# Altium footprint library Modules.PcbLib: 4 footprints
Each footprint in its own frame and in the unit in brackets; x right, y up, seen from the top. Pads: shape width x height; smd on the part's side, far side on the other; paste and mask are expansions set on the pad; w line width, h text height; cw(c..) or ccw(c..) is an arc to the next point about the centre after c.
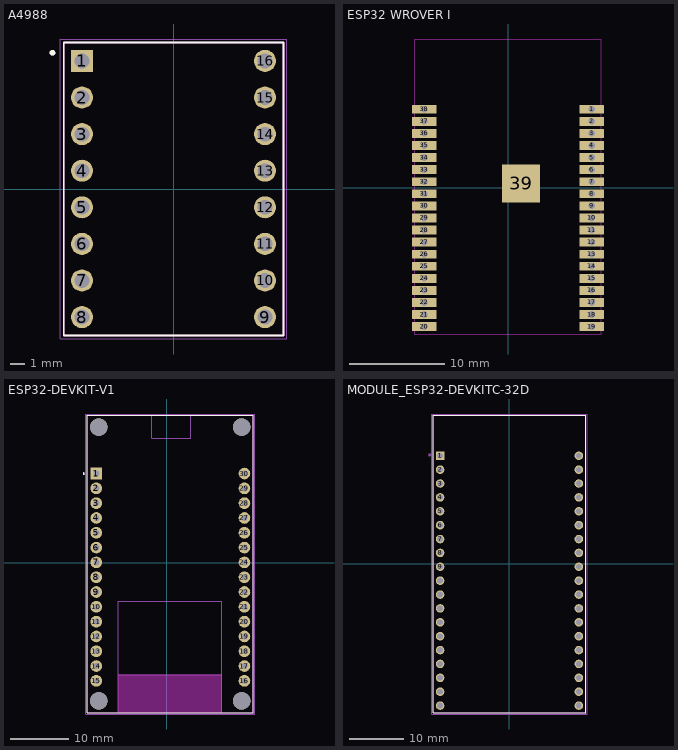
[diagram p0: the footprints below, top view; thin cyan lines are the x and y axes]

## A4988 [mm] "MODULE_A4988_STEPPER_MOTOR_DRIVER_CARRIER"
pads (16):
  rect 1.53x1.53 hole 1.02: 1(-6.35,8.89)
  round 1.53 hole 1.02: 2(-6.35,6.35) 3(-6.35,3.81) 4(-6.35,1.27) 5(-6.35,-1.27) 6(-6.35,-3.81) 7(-6.35,-6.35) 8(-6.35,-8.89) 9(6.35,-8.89) 10(6.35,-6.35) 11(6.35,-3.81) 12(6.35,-1.27) 13(6.35,1.27) 14(6.35,3.81) 15(6.35,6.35) 16(6.35,8.89)
Top Overlay:
  circle w0.2: c-8.4,9.45 r0.1
  lines w0.127: -7.62,-10.16 7.62,-10.16 7.62,10.16 -7.62,10.16 -7.62,-10.16
Mechanical 13:
  circle w0.2: c-8.4,9.45 r0.1
  lines w0.127: -7.62,-10.16 7.62,-10.16 7.62,10.16 -7.62,10.16 -7.62,-10.16
Mechanical 15:
  lines w0.05: -7.87,-10.41 -7.87,10.41 7.87,10.41 7.87,-10.41 -7.87,-10.41
3D body "A4988 STEPPER MOTOR DRIVER CARRIER.STEP": height 5.89, standoff -5.99, extent -7.62,-10.16 7.62,10.16

## ESP32 WROVER I [mm]
pads (39):
  rect 2.6x0.93 hole 0.7: 1(8.81,8.26) 2(8.81,6.99) 3(8.81,5.72) 4(8.81,4.45) 5(8.81,3.18) 6(8.81,1.91) 7(8.81,0.64) 8(8.81,-0.63) 9(8.81,-1.9) 10(8.81,-3.17) 11(8.81,-4.44) 12(8.81,-5.71) 13(8.81,-6.98) 14(8.81,-8.25) 15(8.81,-9.52) 16(8.81,-10.79) 17(8.81,-12.06) 18(8.81,-13.33) 19(8.81,-14.6) 20(-8.81,-14.6) 21(-8.81,-13.33) 22(-8.81,-12.06) 23(-8.81,-10.79) 24(-8.81,-9.52) 25(-8.81,-8.25) 26(-8.81,-6.98) 27(-8.81,-5.71) 28(-8.81,-4.44) 29(-8.81,-3.17) 30(-8.81,-1.9) 31(-8.81,-0.63) 32(-8.81,0.64) 33(-8.81,1.91) 34(-8.81,3.18) 35(-8.81,4.45) 36(-8.81,5.72) 37(-8.81,6.99) 38(-8.81,8.26)
  rect 4x4 smd: 39(1.38,0.47)
Keep-Out Layer:
  lines w0.127: -9.8,-15.4 -9.8,15.65 9.8,15.65 9.8,-15.4 -9.8,-15.4
3D body "ESP32-WROVER-I--3DModel-STEP-56544.STEP": height 3.65, standoff 0, extent -9.025,-15.7 8.975,15.7

## ESP32-DEVKIT-V1 [mm]
pads (34):
  rect 2x2 hole 1.02: 1(-12.098,15.341)
  round 2 hole 1.02: 2(-12.098,12.801) 3(-12.098,10.261) 4(-12.098,7.721) 5(-12.098,5.181) 6(-12.098,2.641) 7(-12.098,0.101) 8(-12.098,-2.439) 9(-12.098,-4.979) 10(-12.098,-7.519) 11(-12.098,-10.059) 12(-12.098,-12.599) 13(-12.098,-15.139) 14(-12.098,-17.679) 15(-12.098,-20.219) 16(13.302,-20.219) 17(13.302,-17.679) 18(13.302,-15.139) 19(13.302,-12.599) 20(13.302,-10.059) 21(13.302,-7.519) 22(13.302,-4.979) 23(13.302,-2.439) 24(13.302,0.101) 25(13.302,2.641) 26(13.302,5.181) 27(13.302,7.721) 28(13.302,10.261) 29(13.302,12.801) 30(13.302,15.341)
  round 3 hole 3 unplated: ""(-11.678,-23.649) ""(-11.678,23.301) ""(12.832,-23.649) ""(12.832,23.301)
Top Overlay:
  circle w0.2: c-14.248,15.341 r0.1
  lines w0.127: -13.678,-25.649 -8.308,-25.649 9.382,-25.649 14.832,-25.649 ; -13.678,-25.649 -13.678,25.301 ; -13.678,-25.649 -13.678,25.301 ; -13.678,-25.649 14.832,-25.649 ; -13.678,25.301 -2.609,25.301 4.102,25.301 14.832,25.301 ; -13.678,25.301 14.832,25.301 ; 14.832,-25.649 14.832,25.301 ; 14.832,-25.649 14.832,25.301
Keep-Out Layer:
  region: 9.382,-25.649 -8.308,-25.649 -8.308,-19.159 9.382,-19.159
  region: 9.382,-25.649 -8.308,-25.649 -8.308,-19.159 9.382,-19.159
  region: 9.382,-25.649 -8.308,-25.649 -8.308,-19.159 9.382,-19.159
Mechanical 13:
  circle w0.2: c-14.248,15.341 r0.1
  lines w0.127: -8.308,-25.649 -8.308,-19.159 ; -8.308,-25.649 9.382,-25.649 ; -8.308,-25.649 -13.678,-25.649 -13.678,25.301 -2.609,25.301 ; -8.308,-19.159 9.382,-19.159 ; -8.308,-19.159 -8.308,-6.529 9.382,-6.529 9.382,-19.159 ; -2.609,25.301 -2.609,21.411 4.102,21.411 4.102,25.301 ; -2.609,25.301 4.102,25.301 ; 4.102,25.301 14.832,25.301 14.832,-25.649 9.382,-25.649 ; 9.382,-25.649 9.382,-19.159
Mechanical 15:
  lines w0.05: -13.928,-25.899 15.082,-25.899 15.082,25.551 -13.928,25.551 -13.928,-25.899
3D body "ESP-32_v1.STEP": height 7.2, standoff -5.2, extent -13.504,-25.629 14.997,25.301

## MODULE_ESP32-DEVKITC-32D [mm]
pads (38):
  rect 1.56x1.56 hole 1.04: 1(-12.7,19.76)
  round 1.56 hole 1.04: 2(-12.7,17.22) 3(-12.7,14.68) 4(-12.7,12.14) 5(-12.7,9.6) 6(-12.7,7.06) 7(-12.7,4.52) 8(-12.7,1.98) 9(-12.7,-0.56) 10(-12.7,-3.1) 11(-12.7,-5.64) 12(-12.7,-8.18) 13(-12.7,-10.72) 14(-12.7,-13.26) 15(-12.7,-15.8) 16(-12.7,-18.34) 17(-12.7,-20.88) 18(-12.7,-23.42) 19(-12.7,-25.96) 20(12.7,19.76) 21(12.7,17.22) 22(12.7,14.68) 23(12.7,12.14) 24(12.7,9.6) 25(12.7,7.06) 26(12.7,4.52) 27(12.7,1.98) 28(12.7,-0.56) 29(12.7,-3.1) 30(12.7,-5.64) 31(12.7,-8.18) 32(12.7,-10.72) 33(12.7,-13.26) 34(12.7,-15.8) 35(12.7,-18.34) 36(12.7,-20.88) 37(12.7,-23.42) 38(12.7,-25.96)
Top Overlay:
  lines w0.127: -13.95,-27.25 -13.95,27.15 13.95,27.15 13.95,-27.25 -13.95,-27.25
Mechanical 13:
  circle w0.28: c-14.6,19.9 r0.14
  lines w0.127: -13.95,-27.25 13.95,-27.25 13.95,27.15 -13.95,27.15 -13.95,-27.25
Mechanical 15:
  lines w0.05: -14.2,-27.5 14.2,-27.5 14.2,27.4 -14.2,27.4 -14.2,-27.5
3D body "step_temp.STEP": height 3.25, standoff -9.44, extent -13.97,-24.8 13.97,30.3